# Altium footprint library My Library.PcbLib: 872 footprints (part 33 of 55)
Each footprint in its own frame and in the unit in brackets; x right, y up, seen from the top. Pads: shape width x height; smd on the part's side, far side on the other; paste and mask are expansions set on the pad; w line width, h text height; cw(c..) or ccw(c..) is an arc to the next point about the centre after c.
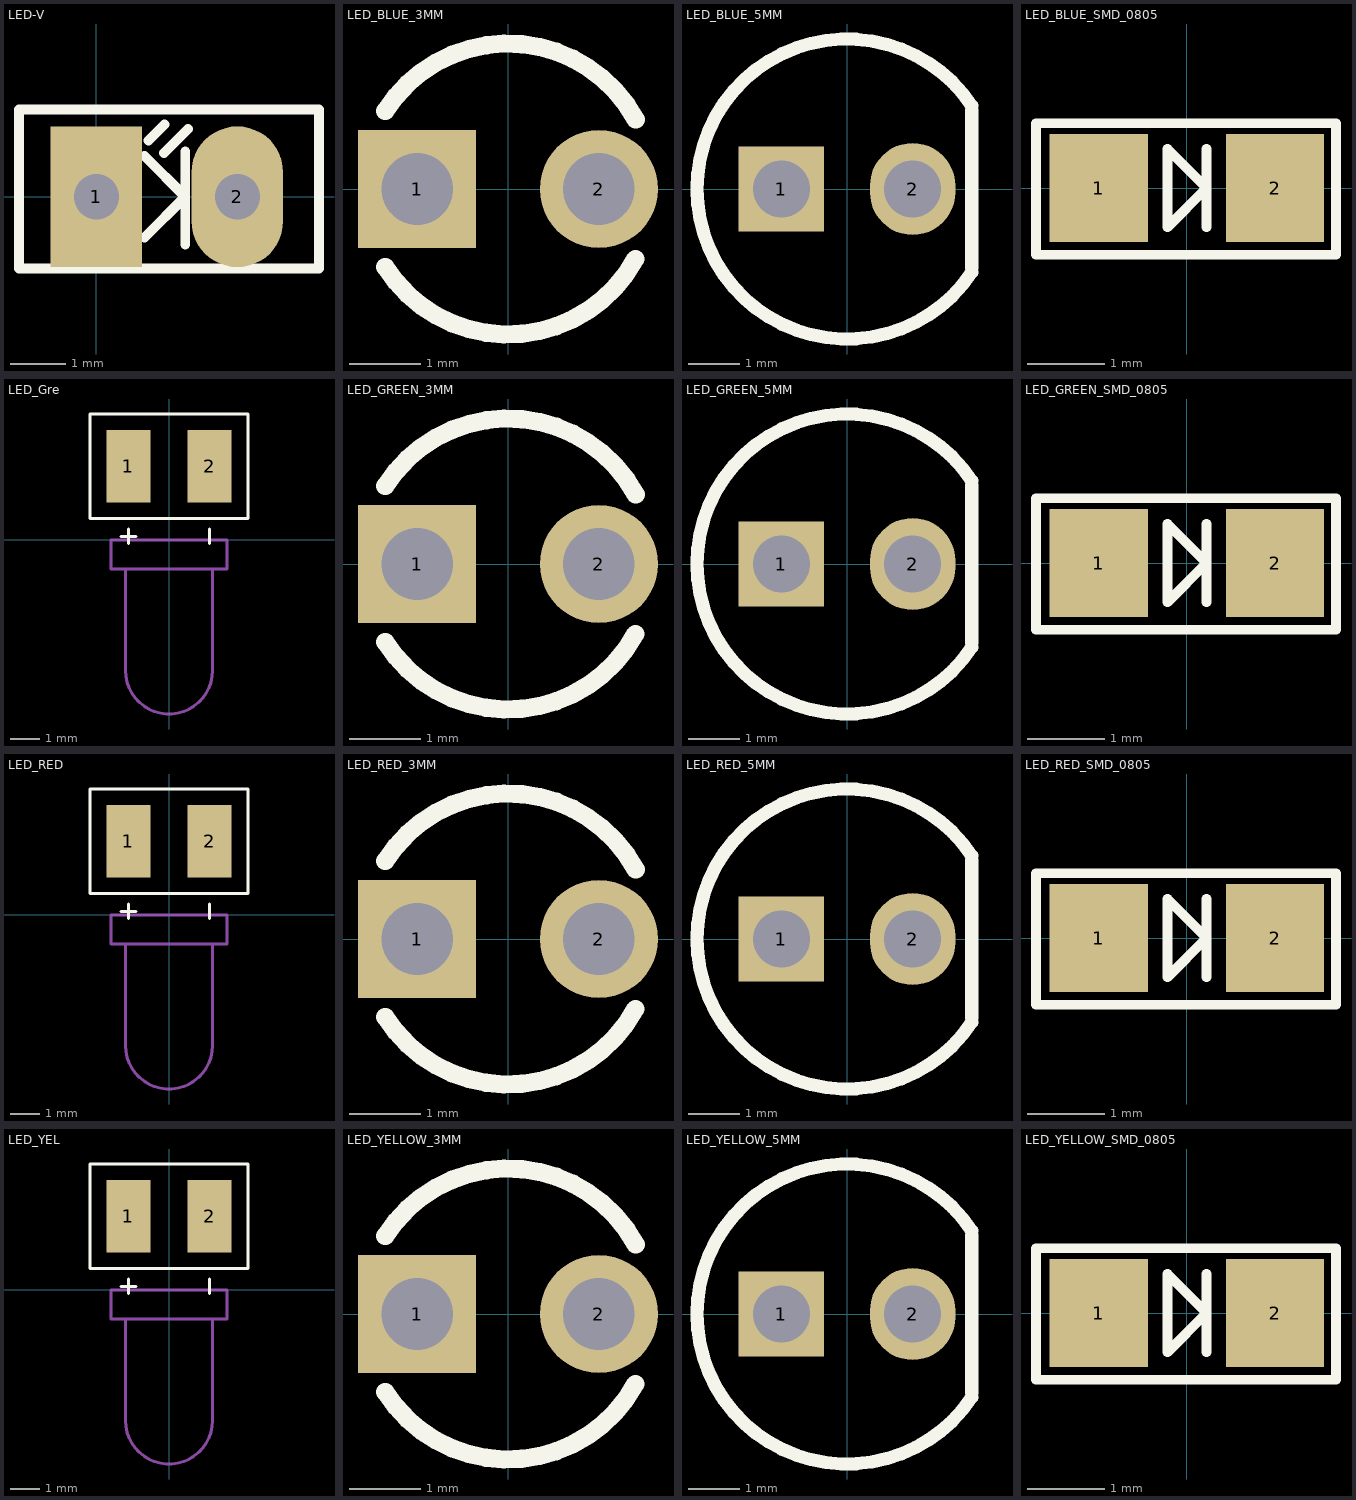
[diagram p32: the footprints below, top view; thin cyan lines are the x and y axes]

## LED-V [mil] "LED 2 PIN, Rectang Only colour"
height 300
pads (2):
  rect 65x100 hole 32: 1(0,0)
  oval 65x100 hole 32: 2(100,0)
Top Overlay:
  lines w7: 34,-29 63,0 34,29 ; 37,40 48.3,51.3 ; 48,31 65,48 ; 63,-34 63,32 ; -55,-51 158,-51 158,62 -55,62 -55,-51

## LED_BLUE_3MM [mil]
pads (2):
  rect 65x65 hole 39.37: 1(-50,0)
  round 65 hole 39.37: 2(50,0)
Top Overlay:
  lines w10: -67.49,-42.95 ccw(c0,0) 70.1,-38.55 ; -67.49,42.95 cw(c0,0) 70.23,38.31
3D body "User Library-LED_d3-BLU.STEP": height 195.87, standoff -98.43, extent -65.51,-65.12 61,64.79

## LED_BLUE_5MM [mil]
pads (2):
  rect 65x65 hole 43.31: 1(-50,0)
  oval 65x70 hole 43.31: 2(50,0)
Top Overlay:
  lines w10: 95,-63.33 cw(c0,0) 95,63.33 ; 95,-60 95,60
3D body "User Library-LEDd5B.STEP": height 343.02, standoff -239.66, extent -117.31,-118.49 96.08,118.51

## LED_BLUE_SMD_0805 [mil]
pads (2):
  rect 50x55 smd: 1(-45,0) 2(45,0)
Top Overlay:
  lines w5: 10,-20 10,20 ; -77,-34 76,-34 76,33 -77,33 -77,-34 ; -10,-20 -10,20 10,0 -10,-20
3D body "User Library-LED0805.STEP": height 31.99, standoff 0.5, extent -41.34,-26.58 41.33,26.58

## LED_Gre [mil]
pads (2):
  rect 60x98.43 smd: 1(-55,100) 2(55,100)
Top Overlay:
  lines w4: -65,5 -55,5 ; -55,-5 -55,5 ; -55,15 -55,5 ; -45,5 -55,5 ; 55,-5 55,5 55,15 ; -107,29 -107,171 107,171 107,29 -107,29
Mechanical 1:
  lines w4: -59.04,-39.37 -59.04,-177.15 ccw(c0,-177.17) 59.06,-177.17 59.06,-39.39 ; -78.74,-39.37 -78.74,0 78.74,0 78.74,-39.37 -78.74,-39.37
3D body: height 15.75, standoff 0, extent 45,90 65,130
3D body: height 66.93, standoff 0, extent 45,75 65,90
3D body: height 66.93, standoff 51.18, extent 45,0 65,75
3D body: height 118.11, standoff 0, extent -59.32,-236.49 58.17,-118.88
3D body: height 137.64, standoff -19.53, extent -78.72,-39.35 78.14,0.02
3D body: height 117.99, standoff 0.12, extent -59.04,-177.15 58.61,-39.35
3D body: height 66.93, standoff 51.18, extent -65,0 -45,75
3D body: height 66.93, standoff 0, extent -65,75 -45,90
3D body: height 15.75, standoff 0, extent -65,90 -45,130

## LED_GREEN_3MM [mil]
pads (2):
  rect 65x65 hole 39.37: 1(-50,0)
  round 65 hole 39.37: 2(50,0)
Top Overlay:
  lines w10: -67.49,-42.95 ccw(c0,0) 70.1,-38.55 ; -67.49,42.95 cw(c0,0) 70.23,38.31
3D body "User Library-LED-D3G.STEP": height 181.61, standoff -255.4, extent -78.75,-78.75 65.61,78.73

## LED_GREEN_5MM [mil]
pads (2):
  rect 65x65 hole 43.31: 1(-50,0)
  oval 65x70 hole 43.31: 2(50,0)
Top Overlay:
  lines w10: 95,-63.33 cw(c0,0) 95,63.33 ; 95,-60 95,60
3D body "User Library-LED-D5G.STEP": height 356.1, standoff -251.97, extent -118.11,-118.11 98.43,118.11

## LED_GREEN_SMD_0805 [mil]
pads (2):
  rect 50x55 smd: 1(-45,0) 2(45,0)
Top Overlay:
  lines w5: 10,-20 10,20 ; -77,-34 -77,33 76,33 76,-34 -77,-34 ; -10,-20 10,0 -10,20 -10,-20
3D body "User Library-User Library-led_0805 GRE.STEP": height 43.31, standoff 0, extent -39.77,-24.61 39.76,24.6

## LED_RED [mil]
pads (2):
  rect 60x98.43 smd: 1(-55,100) 2(55,100)
Top Overlay:
  lines w4: -65,5 -55,5 ; -55,-5 -55,5 ; -55,15 -55,5 ; -45,5 -55,5 ; 55,-5 55,5 55,15 ; -107,29 -107,171 107,171 107,29 -107,29
Mechanical 1:
  lines w4: -59.04,-39.37 -59.04,-177.15 ccw(c0,-177.17) 59.06,-177.17 59.06,-39.39 ; -78.74,-39.37 -78.74,0 78.74,0 78.74,-39.37 -78.74,-39.37
3D body: height 118.11, standoff 0, extent -59.32,-236.49 58.17,-118.88
3D body: height 137.64, standoff -19.53, extent -78.72,-39.35 78.14,0.02
3D body: height 117.99, standoff 0.12, extent -59.04,-177.15 58.61,-39.35
3D body: height 66.93, standoff -39.37, extent 45,75 65,90
3D body: height 66.93, standoff 51.18, extent 45,0 65,75
3D body: height 66.93, standoff 51.18, extent -65,0 -45,75
3D body: height 66.93, standoff -39.37, extent -65,75 -45,90

## LED_RED_3MM [mil]
pads (2):
  rect 65x65 hole 39.37: 1(-50,0)
  round 65 hole 39.37: 2(50,0)
Top Overlay:
  lines w10: -67.49,-42.95 ccw(c0,0) 70.1,-38.55 ; -67.49,42.95 cw(c0,0) 70.23,38.31
3D body "User Library-LED-D3R.STEP": height 181.61, standoff -255.4, extent -78.74,-78.75 65.61,78.73

## LED_RED_5MM [mil]
pads (2):
  rect 65x65 hole 43.31: 1(-50,0)
  oval 65x70 hole 43.31: 2(50,0)
Top Overlay:
  lines w10: 95,-63.33 cw(c0,0) 95,63.33 ; 95,-60 95,60
3D body "User Library-LED-D5R.STEP": height 356.1, standoff -251.97, extent -118.11,-118.11 98.43,118.11

## LED_RED_SMD_0805 [mil]
pads (2):
  rect 50x55 smd: 1(-45,0) 2(45,0)
Top Overlay:
  lines w5: 10,-20 10,20 ; -77,-34 76,-34 76,33 -77,33 -77,-34 ; -10,-20 -10,20 10,0 -10,-20
3D body "User Library-CHIPLED-0805.STEP": height 35.43, standoff -0.39, extent -41.34,-26.57 41.33,26.58

## LED_YEL [mil]
pads (2):
  rect 60x98.43 smd: 1(-55,100) 2(55,100)
Top Overlay:
  lines w4: -65,5 -55,5 ; -55,-5 -55,5 ; -55,15 -55,5 ; -45,5 -55,5 ; 55,-5 55,5 55,15 ; -107,29 -107,171 107,171 107,29 -107,29
Mechanical 1:
  lines w4: -59.04,-39.37 -59.04,-177.15 ccw(c0,-177.17) 59.06,-177.17 59.06,-39.39 ; -78.74,-39.37 -78.74,0 78.74,0 78.74,-39.37 -78.74,-39.37
3D body: height 15.75, standoff 0, extent -65,90 -45,130
3D body: height 66.93, standoff 0, extent -65,75 -45,90
3D body: height 66.93, standoff 51.18, extent -65,0 -45,75
3D body: height 66.93, standoff 51.18, extent 45,0 65,75
3D body: height 66.93, standoff 0, extent 45,75 65,90
3D body: height 15.75, standoff 0, extent 45,90 65,130
3D body: height 118.11, standoff 0, extent -59.32,-236.49 58.17,-118.88
3D body: height 137.64, standoff -19.53, extent -78.72,-39.35 78.14,0.02
3D body: height 117.99, standoff 0.12, extent -59.04,-177.15 58.61,-39.35

## LED_YELLOW_3MM [mil]
pads (2):
  rect 65x65 hole 39.37: 1(-50,0)
  round 65 hole 39.37: 2(50,0)
Top Overlay:
  lines w10: -67.49,-42.95 ccw(c0,0) 70.1,-38.55 ; -67.49,42.95 cw(c0,0) 70.23,38.31
3D body "User Library-LED-D3Y.STEP": height 181.61, standoff -255.4, extent -78.74,-78.74 65.61,78.74

## LED_YELLOW_5MM [mil]
pads (2):
  rect 65x65 hole 43.31: 1(-50,0)
  oval 65x70 hole 43.31: 2(50,0)
Top Overlay:
  lines w10: 95,-63.33 cw(c0,0) 95,63.33 ; 95,-60 95,60
3D body "User Library-LED-D5Y.STEP": height 356.1, standoff -251.97, extent -118.11,-118.11 98.42,118.11

## LED_YELLOW_SMD_0805 [mil]
pads (2):
  rect 50x55 smd: 1(-45,0) 2(45,0)
Top Overlay:
  lines w5: 10,-20 10,20 ; -77,-34 -77,33 76,33 76,-34 -77,-34 ; -10,-20 10,0 -10,20 -10,-20
3D body "User Library-User Library-led_0805 YEL.STEP": height 43.31, standoff 0, extent -39.77,-24.61 39.76,24.6